# Altium footprint library BASIC.PcbLib: 244 footprints (part 4 of 16)
Each footprint in its own frame and in the unit in brackets; x right, y up, seen from the top. Pads: shape width x height; smd on the part's side, far side on the other; paste and mask are expansions set on the pad; w line width, h text height; cw(c..) or ccw(c..) is an arc to the next point about the centre after c.
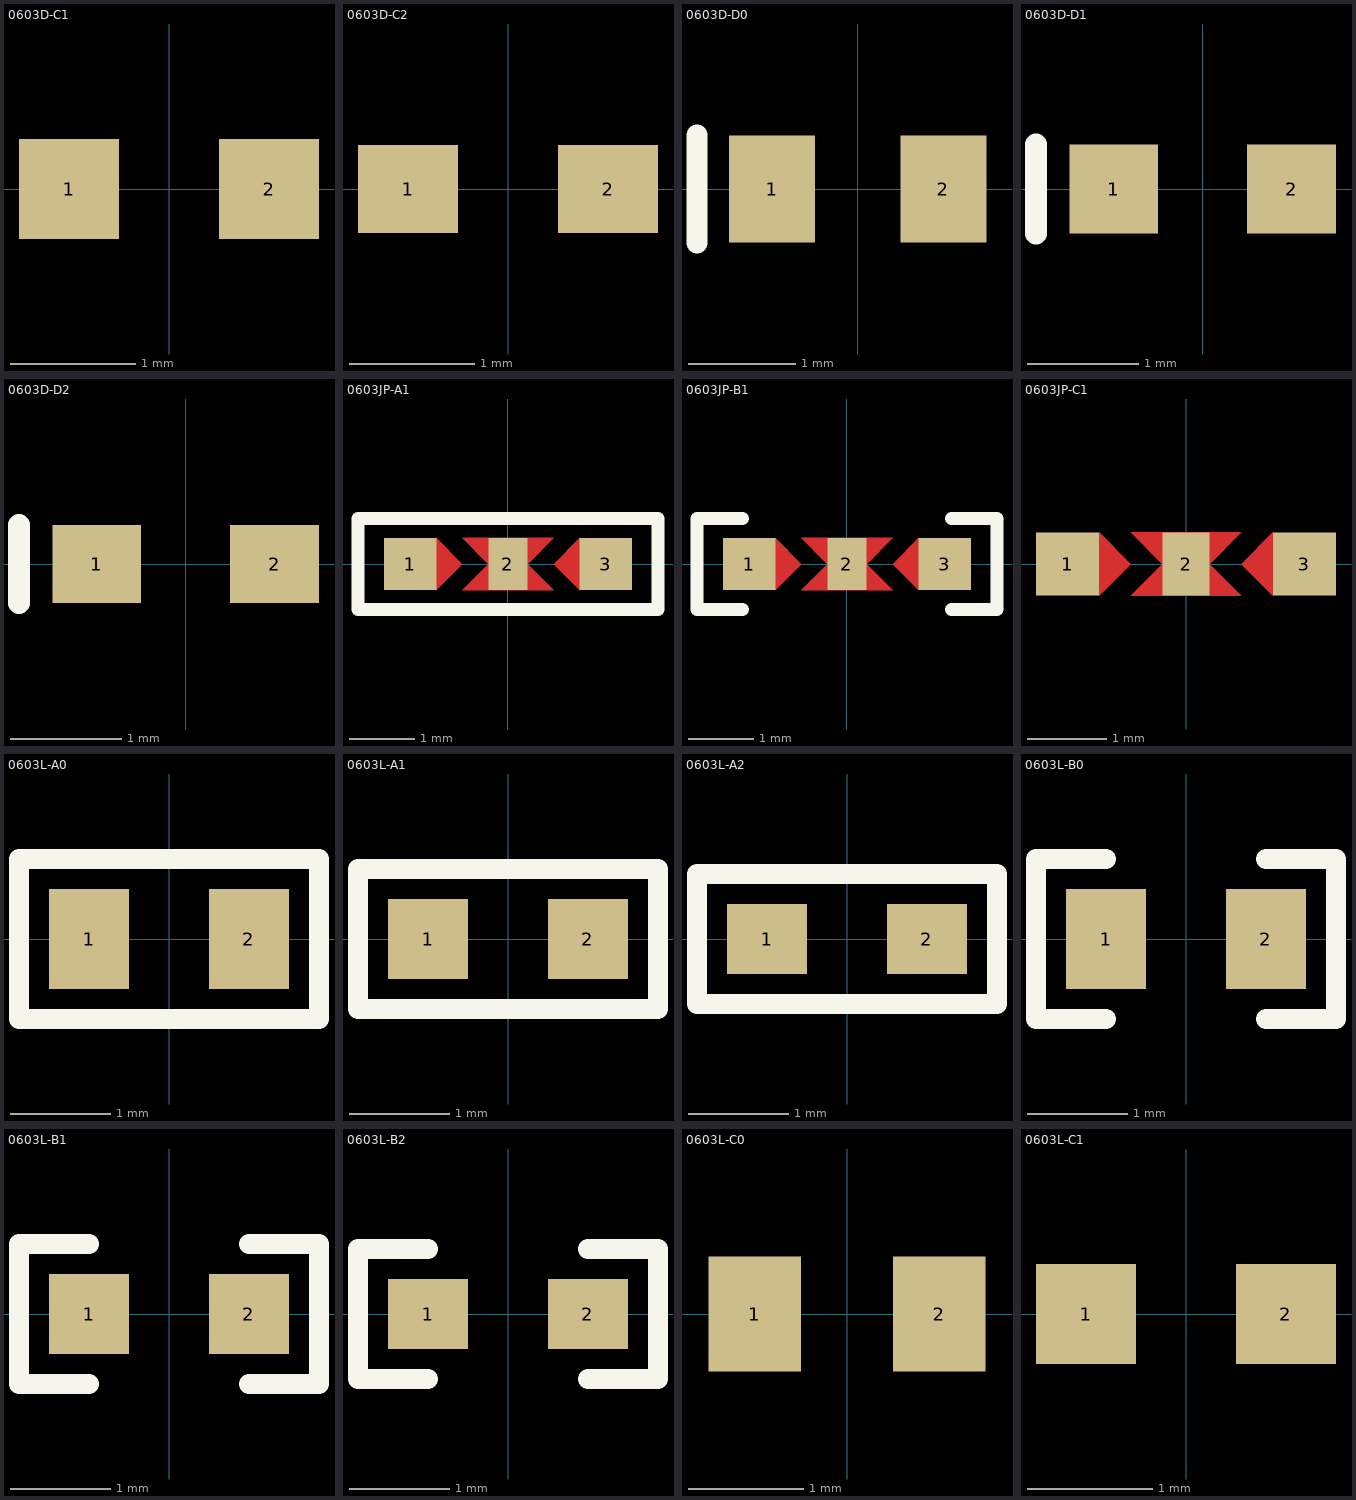
[diagram p3: the footprints below, top view; thin cyan lines are the x and y axes]

## 0603D-C1 [mm]
height 0.6
pads (2):
  rect 0.8x0.8 smd: 1(-0.8,0) 2(0.8,0)
3D body "RES0603-3.step": height 0.45, standoff 0, extent -0.8,-0.4 0.8,0.4

## 0603D-C2 [mm]
height 0.6
pads (2):
  rect 0.8x0.7 smd: 1(-0.8,0) 2(0.8,0)
3D body "RES0603-3.step": height 0.45, standoff 0, extent -0.8,-0.4 0.8,0.4

## 0603D-D0 [mm]
height 0.6
pads (2):
  rect 0.8x1 smd: 1(-0.8,0) 2(0.8,0)
Top Overlay:
  lines w0.2: -1.5,-0.5 -1.5,0.5
3D body "RES0603-3.step": height 0.45, standoff 0, extent -0.8,-0.4 0.8,0.4

## 0603D-D1 [mm]
height 0.6
pads (2):
  rect 0.8x0.8 smd: 1(-0.8,0) 2(0.8,0)
Top Overlay:
  lines w0.2: -1.5,-0.4 -1.5,0.4
3D body "RES0603-3.step": height 0.45, standoff 0, extent -0.8,-0.4 0.8,0.4

## 0603D-D2 [mm]
height 0.6
pads (2):
  rect 0.8x0.7 smd: 1(-0.8,0) 2(0.8,0)
Top Overlay:
  lines w0.2: -1.5,-0.35 -1.5,0.35
3D body "RES0603-3.step": height 0.45, standoff 0, extent -0.8,-0.4 0.8,0.4

## 0603JP-A1 [mm]
height 0.6
pads (3):
  rect 0.8x0.8 smd: 1(-1.5,0) 3(1.5,0)
  rect 0.6x0.8 smd: 2(0,0)
Top Layer:
  region: 1.1,0.4 0.7,0 1.1,-0.4
  region: -0.7,0.4 -0.3,0 -0.7,-0.4 0.7,-0.4 0.3,0 0.7,0.4
  region: -1.1,0.4 -0.7,0 -1.1,-0.4
Top Overlay:
  lines w0.2: -2.3,-0.7 2.3,-0.7 2.3,0.7 -2.3,0.7 -2.3,-0.7
Top Solder:
  region: -1.1,0.5 -0.6,0 -1.1,-0.5
  region: -0.85,0.5 -0.85,0.4 -0.45,0 -0.85,-0.4 -0.85,-0.5 0.85,-0.5 0.85,-0.4 0.45,0 0.85,0.4 0.85,0.5
  region: 1.1,-0.5 0.6,0 1.1,0.5
3D body "RES0603-3.step": height 0.45, standoff 0, extent -1.5,-0.4 0.1,0.4

## 0603JP-B1 [mm]
height 0.6
pads (3):
  rect 0.8x0.8 smd: 1(-1.5,0) 3(1.5,0)
  rect 0.6x0.8 smd: 2(0,0)
Top Layer:
  region: 1.1,0.4 0.7,0 1.1,-0.4
  region: -0.7,0.4 -0.3,0 -0.7,-0.4 0.7,-0.4 0.3,0 0.7,0.4
  region: -1.1,0.4 -0.7,0 -1.1,-0.4
Top Overlay:
  lines w0.2: -1.6,-0.7 -2.3,-0.7 -2.3,0.7 -1.6,0.7 ; 1.6,-0.7 2.3,-0.7 2.3,0.7 1.6,0.7
Top Solder:
  region: -1.1,0.5 -0.6,0 -1.1,-0.5
  region: -0.85,0.5 -0.85,0.4 -0.45,0 -0.85,-0.4 -0.85,-0.5 0.85,-0.5 0.85,-0.4 0.45,0 0.85,0.4 0.85,0.5
  region: 1.1,-0.5 0.6,0 1.1,0.5
3D body "RES0603-3.step": height 0.45, standoff 0, extent -1.5,-0.4 0.1,0.4

## 0603JP-C1 [mm]
height 0.6
pads (3):
  rect 0.8x0.8 smd: 1(-1.5,0) 3(1.5,0)
  rect 0.6x0.8 smd: 2(0,0)
Top Layer:
  region: -1.1,0.4 -0.7,0 -1.1,-0.4
  region: -0.7,0.4 -0.3,0 -0.7,-0.4 0.7,-0.4 0.3,0 0.7,0.4
  region: 1.1,0.4 0.7,0 1.1,-0.4
Top Solder:
  region: 1.1,-0.5 0.6,0 1.1,0.5
  region: -0.85,0.5 -0.85,0.4 -0.45,0 -0.85,-0.4 -0.85,-0.5 0.85,-0.5 0.85,-0.4 0.45,0 0.85,0.4 0.85,0.5
  region: -1.1,0.5 -0.6,0 -1.1,-0.5
3D body "RES0603-3.step": height 0.45, standoff 0, extent -1.5,-0.4 0.1,0.4

## 0603L-A0 [mm]
pads (2):
  rect 0.8x1 smd: 1(-0.8,0) 2(0.8,0)
Top Overlay:
  lines w0.2: -1.5,-0.8 1.5,-0.8 1.5,0.8 -1.5,0.8 -1.5,-0.8
3D body "tfpt0603l1200fv.stp": height 0.45, standoff 0, extent -0.8,-0.4 0.8,0.4

## 0603L-A1 [mm]
pads (2):
  rect 0.8x0.8 smd: 1(-0.8,0) 2(0.8,0)
Top Overlay:
  lines w0.2: -1.5,-0.7 -1.5,0.7 1.5,0.7 1.5,-0.7 -1.5,-0.7
3D body "tfpt0603l1200fv.stp": height 0.45, standoff 0, extent -0.8,-0.4 0.8,0.4

## 0603L-A2 [mm]
pads (2):
  rect 0.8x0.7 smd: 1(-0.8,0) 2(0.8,0)
Top Overlay:
  lines w0.2: -1.5,-0.65 -1.5,0.65 1.5,0.65 1.5,-0.65 -1.5,-0.65
3D body "tfpt0603l1200fv.stp": height 0.45, standoff 0, extent -0.8,-0.4 0.8,0.4

## 0603L-B0 [mm]
pads (2):
  rect 0.8x1 smd: 1(-0.8,0) 2(0.8,0)
Top Overlay:
  lines w0.2: -0.8,-0.8 -1.5,-0.8 -1.5,0.8 -0.8,0.8 ; 0.8,-0.8 1.5,-0.8 1.5,0.8 0.8,0.8
3D body "tfpt0603l1200fv.stp": height 0.45, standoff 0, extent -0.8,-0.4 0.8,0.4

## 0603L-B1 [mm]
pads (2):
  rect 0.8x0.8 smd: 1(-0.8,0) 2(0.8,0)
Top Overlay:
  lines w0.2: -0.8,-0.7 -1.5,-0.7 -1.5,0.7 -0.8,0.7 ; 0.8,-0.7 1.5,-0.7 1.5,0.7 0.8,0.7
3D body "tfpt0603l1200fv.stp": height 0.45, standoff 0, extent -0.8,-0.4 0.8,0.4

## 0603L-B2 [mm]
pads (2):
  rect 0.8x0.7 smd: 1(-0.8,0) 2(0.8,0)
Top Overlay:
  lines w0.2: -0.8,-0.65 -1.5,-0.65 -1.5,0.65 -0.8,0.65 ; 0.8,-0.65 1.5,-0.65 1.5,0.65 0.8,0.65
3D body "tfpt0603l1200fv.stp": height 0.45, standoff 0, extent -0.8,-0.4 0.8,0.4

## 0603L-C0 [mm]
pads (2):
  rect 0.8x1 smd: 1(-0.8,0) 2(0.8,0)
3D body "tfpt0603l1200fv.stp": height 0.45, standoff 0, extent -0.8,-0.4 0.8,0.4

## 0603L-C1 [mm]
pads (2):
  rect 0.8x0.8 smd: 1(-0.8,0) 2(0.8,0)
3D body "tfpt0603l1200fv.stp": height 0.45, standoff 0, extent -0.8,-0.4 0.8,0.4